# Altium footprint library 6-Connectors-2.PcbLib: 57 footprints (part 6 of 7) (continued)
## HARTING_09 06 231 6822 [mm] "DIN 41612, Type MH, 24+ 7 Contacts, Rows z+b+d, Performance level 2, Straight Female Connector"
height 20.53
pads (24):
  round 1.7 hole 1: b2(0,-2.54) b4(0,-7.62) b6(0,-12.7) b8(0,-17.78) b10(0,-22.86) b12(0,-27.94) b14(0,-33.02) b16(0,-38.1) d2(3.81,-2.54) d4(3.81,-7.62) d6(3.81,-12.7) d8(3.81,-17.78) d10(3.81,-22.86) d12(3.81,-27.94) d14(3.81,-33.02) d16(3.81,-38.1) z2(-3.81,-2.54) z4(-3.81,-7.62) z6(-3.81,-12.7) z8(-3.81,-17.78) z10(-3.81,-22.86) z12(-3.81,-27.94) z14(-3.81,-33.02) z16(-3.81,-38.1)
Top Overlay:
  lines w0.2: -5.025,-79.965 -1.475,-79.965 ; -5.025,-79.965 -5.025,-72.435 ; -5.025,-79.965 -1.475,-72.435 ; -5.025,-72.435 -1.475,-72.435 ; -5.025,-72.435 -1.475,-79.965 ; -5.025,-69.805 -1.475,-69.805 ; -5.025,-69.805 -5.025,-62.275 ; -5.025,-69.805 -1.475,-62.275 ; -5.025,-62.275 -1.475,-62.275 ; -5.025,-62.275 -1.475,-69.805 ; -5.025,-59.645 -1.475,-59.645 ; -5.025,-59.645 -5.025,-52.115 ; -5.025,-59.645 -1.475,-52.115 ; -5.025,-52.115 -1.475,-52.115 ; -5.025,-52.115 -1.475,-59.645 ; -5.025,-49.485 -1.475,-49.485 ; -5.025,-49.485 -5.025,-41.955 ; -5.025,-49.485 -1.475,-41.955 ; -5.025,-41.955 -1.475,-41.955 ; -5.025,-41.955 -1.475,-49.485 ; -1.475,-79.965 -1.475,-72.435 ; -1.475,-69.805 -1.475,-62.275 ; -1.475,-59.645 -1.475,-52.115 ; -1.475,-49.485 -1.475,-41.955 ; 1.475,-74.885 1.475,-67.355 ; 1.475,-74.885 5.025,-67.355 ; 1.475,-74.885 5.025,-74.885 ; 1.475,-67.355 5.025,-74.885 ; 1.475,-67.355 5.025,-67.355 ; 1.475,-64.725 5.025,-64.725 ; 1.475,-64.725 1.475,-57.195 ; 1.475,-64.725 5.025,-57.195 ; 1.475,-57.195 5.025,-57.195 ; 1.475,-57.195 5.025,-64.725 ; 1.475,-54.565 5.025,-54.565 ; 1.475,-54.565 1.475,-47.035 ; 1.475,-54.565 5.025,-47.035 ; 1.475,-47.035 5.025,-47.035 ; 1.475,-47.035 5.025,-54.565 ; 5.025,-74.885 5.025,-67.355 ; 5.025,-64.725 5.025,-57.195 ; 5.025,-54.565 5.025,-47.035 ; -7.35,-85.745 ccw(c-6.35,-85.745) -6.35,-86.745 6.35,-86.745 ccw(c6.35,-85.745) 7.35,-85.745 7.35,7.005 ccw(c6.35,7.005) 6.35,8.005 -6.35,8.005 ccw(c-6.35,7.005) -7.35,7.005 -7.35,-85.745 ; -6.185,-81.795 -6.185,3.055 6.185,3.055 6.185,-81.795 4.165,-81.795 4.165,-80.265 -4.165,-80.265 -4.165,-81.795 -6.185,-81.795
  text "30" at -10.109,-71.56 h1.2
  text "26" at -10.109,-61.4 h1.2
  text "22" at -10.109,-51.24 h1.2
  text "32" at -10.1,-76.605 h1.2
  text "28" at -10.1,-66.445 h1.2
  text "24" at -10.1,-56.285 h1.2
  text "d" at 3.492,-0.635 h1.2
  text "z" at -4.127,-0.635 h1.2
  text "b" at -0.318,-0.635 h1.2
  text "5" at -8.925,-10.725 h1.2
  text "10" at -9.885,-23.42 h1.2
  text "15" at -9.885,-36.12 h1.2
  text "20" at -10.1,-46.125 h1.2
  text "1" at -8.625,-0.525 h1.2
Mechanical 8:
  lines w0.1: -7.35,-40.64 -6.85,-40.64 ; -6.35,-40.64 -5.85,-40.64 ; -5.35,-40.64 -4.85,-40.64 ; -4.35,-40.64 -3.85,-40.64 ; -4.31,-38.1 -3.81,-38.1 ; -4.31,-33.02 -3.81,-33.02 ; -4.31,-27.94 -3.81,-27.94 ; -4.31,-22.86 -3.81,-22.86 ; -4.31,-17.78 -3.81,-17.78 ; -4.31,-12.7 -3.81,-12.7 ; -4.31,-7.62 -3.81,-7.62 ; -3.81,-38.6 -3.81,-38.1 ; -3.81,-37.6 -3.81,-38.1 ; -3.81,-33.52 -3.81,-33.02 ; -3.81,-32.52 -3.81,-33.02 ; -3.81,-28.44 -3.81,-27.94 ; -3.81,-27.44 -3.81,-27.94 ; -3.81,-23.36 -3.81,-22.86 ; -3.81,-22.36 -3.81,-22.86 ; -3.81,-18.28 -3.81,-17.78 ; -3.81,-17.28 -3.81,-17.78 ; -3.81,-13.2 -3.81,-12.7 ; -3.81,-12.2 -3.81,-12.7 ; -3.81,-8.12 -3.81,-7.62 ; -3.81,-7.12 -3.81,-7.62 ; -3.35,-40.64 -2.85,-40.64 ; -3.31,-38.1 -3.81,-38.1 ; -3.31,-33.02 -3.81,-33.02 ; -3.31,-27.94 -3.81,-27.94 ; -3.31,-22.86 -3.81,-22.86 ; -3.31,-17.78 -3.81,-17.78 ; -3.31,-12.7 -3.81,-12.7 ; -3.31,-7.62 -3.81,-7.62 ; -2.35,-40.64 -1.85,-40.64 ; -1.35,-40.64 -0.65,-40.64 ; -0.8,-84.37 -0.3,-84.37 ; -0.8,5.63 -0.3,5.63 ; -0.5,-38.1 0,-38.1 ; -0.5,-33.02 0,-33.02 ; -0.5,-27.94 0,-27.94 ; -0.5,-22.86 0,-22.86 ; -0.5,-17.78 0,-17.78 ; -0.5,-12.7 0,-12.7 ; -0.5,-7.62 0,-7.62 ; -0.5,-2.54 0,-2.54 ; -0.3,-84.87 -0.3,-84.37 ; -0.3,-83.87 -0.3,-84.37 ; -0.3,5.13 -0.3,5.63 ; -0.3,6.13 -0.3,5.63 ; -0.15,-40.64 0.35,-40.64 ; 0,-38.6 0,-38.1 ; 0,-37.6 0,-38.1 ; 0,-33.52 0,-33.02 ; 0,-32.52 0,-33.02 ; 0,-28.44 0,-27.94 ; 0,-27.44 0,-27.94 ; 0,-23.36 0,-22.86 ; 0,-22.36 0,-22.86 ; 0,-18.28 0,-17.78 ; 0,-17.28 0,-17.78 ; 0,-13.2 0,-12.7 ; 0,-12.2 0,-12.7 ; 0,-8.12 0,-7.62 ; 0,-7.12 0,-7.62 ; 0,-3.04 0,-2.54 ; 0,-2.04 0,-2.54 ; 0.2,-84.37 -0.3,-84.37 ; 0.2,5.63 -0.3,5.63 ; 0.5,-38.1 0,-38.1 ; 0.5,-33.02 0,-33.02 ; 0.5,-27.94 0,-27.94 ; 0.5,-22.86 0,-22.86 ; 0.5,-17.78 0,-17.78 ; 0.5,-12.7 0,-12.7 ; 0.5,-7.62 0,-7.62 ; 0.5,-2.54 0,-2.54 ; 0.85,-40.64 1.35,-40.64 ; 1.85,-40.64 2.35,-40.64 ; 2.85,-40.64 3.35,-40.64 ; 3.31,-38.1 3.81,-38.1 ; 3.31,-33.02 3.81,-33.02 ; 3.31,-27.94 3.81,-27.94 ; 3.31,-22.86 3.81,-22.86 ; 3.31,-17.78 3.81,-17.78 ; 3.31,-12.7 3.81,-12.7 ; 3.31,-7.62 3.81,-7.62 ; 3.31,-2.54 3.81,-2.54 ; 3.81,-38.6 3.81,-38.1 ; 3.81,-37.6 3.81,-38.1 ; 3.81,-33.52 3.81,-33.02 ; 3.81,-32.52 3.81,-33.02 ; 3.81,-28.44 3.81,-27.94 ; 3.81,-27.44 3.81,-27.94 ; 3.81,-23.36 3.81,-22.86 ; 3.81,-22.36 3.81,-22.86 ; 3.81,-18.28 3.81,-17.78 ; 3.81,-17.28 3.81,-17.78 ; 3.81,-13.2 3.81,-12.7 ; 3.81,-12.2 3.81,-12.7 ; 3.81,-8.12 3.81,-7.62 ; 3.81,-7.12 3.81,-7.62 ; 3.81,-3.04 3.81,-2.54 ; 3.81,-2.04 3.81,-2.54 ; 3.85,-40.64 4.35,-40.64 ; 4.31,-38.1 3.81,-38.1 ; 4.31,-33.02 3.81,-33.02 ; 4.31,-27.94 3.81,-27.94 ; 4.31,-22.86 3.81,-22.86 ; 4.31,-17.78 3.81,-17.78 ; 4.31,-12.7 3.81,-12.7 ; 4.31,-7.62 3.81,-7.62 ; 4.31,-2.54 3.81,-2.54 ; 4.85,-40.64 5.35,-40.64 ; 5.85,-40.64 6.35,-40.64 ; 6.85,-40.64 7.35,-40.64 ; -3.81,-2.54 -3.81,-3.04 -3.81,-2.54 ; -3.81,-2.54 -3.31,-2.54 -3.81,-2.54 ; -3.81,-2.54 -3.81,-2.04 -3.81,-2.54 ; -3.81,-2.54 -4.31,-2.54 -3.81,-2.54
Mechanical 14:
  drawing of 190 lines, arcs and shapes, not listed
  text "b" at -0.318,-0.635 h1.2
  text "z" at -4.127,-0.635 h1.2
  text "d" at 3.492,-0.635 h1.2
  text "30" at -10.109,-71.56 h1.2
  text "26" at -10.109,-61.4 h1.2
  text "22" at -10.109,-51.24 h1.2
  text "32" at -10.1,-76.605 h1.2
  text "28" at -10.1,-66.445 h1.2
  text "24" at -10.1,-56.285 h1.2
  text "5" at -8.925,-10.725 h1.2
  text "10" at -9.885,-23.42 h1.2
  text "15" at -9.885,-36.12 h1.2
  text "20" at -10.1,-46.125 h1.2
  text "1" at -8.625,-0.525 h1.2
3D body "HARTING_09 06 231 6822.stp": height 19.94, standoff -10.98, extent -7.35,-86.745 7.35,8.005

## HARTING_09 06 248 6832 [mm] "DIN 41612, Type F,  Thru-Hole Press-in Terminations;Rows z+b+d, 48 Contacts, Straight Female Connector, Performance level 2, Lead 5.6mm"
height 10.1
pads (50):
  round 1.7 hole 1: b2(3.81,-2.54) b4(3.81,-7.62) b6(3.81,-12.7) b8(3.81,-17.78) b10(3.81,-22.86) b12(3.81,-27.94) b14(3.81,-33.02) b16(3.81,-38.1) b18(3.81,-43.18) b20(3.81,-48.26) b22(3.81,-53.34) b24(3.81,-58.42) b26(3.81,-63.5) b28(3.81,-68.58) b30(3.81,-73.66) b32(3.81,-78.74) d2(7.62,-2.54) d4(7.62,-7.62) d6(7.62,-12.7) d8(7.62,-17.78) d10(7.62,-22.86) d12(7.62,-27.94) d14(7.62,-33.02) d16(7.62,-38.1) d18(7.62,-43.18) d20(7.62,-48.26) d22(7.62,-53.34) d24(7.62,-58.42) d26(7.62,-63.5) d28(7.62,-68.58) d30(7.62,-73.66) d32(7.62,-78.74) z2(0,-2.54) z4(0,-7.62) z6(0,-12.7) z8(0,-17.78) z10(0,-22.86) z12(0,-27.94) z14(0,-33.02) z16(0,-38.1) z18(0,-43.18) z20(0,-48.26) z22(0,-53.34) z24(0,-58.42) z26(0,-63.5) z28(0,-68.58) z30(0,-73.66) z32(0,-78.74)
  round 3.5 / inner round 3.5 / far side round 5.1 hole 2.8: MTG1(3.51,5.63) MTG2(3.51,-84.37)
Top Overlay:
  lines w0.2: -3.54,-85.22 -0.58,-85.22 -0.58,-81.845 ; -3.54,-79.57 -2.365,-79.57 ; -3.54,0.83 -2.365,0.83 ; -3.54,6.48 -0.58,6.48 -0.58,3.105 ; 0.535,-86.82 0.535,-84.37 1.993,-81.845 ; 0.535,8.08 0.535,5.63 1.993,3.105 ; 2.492,-86.82 -2.54,-86.82 cw(c-2.54,-85.82) -3.54,-85.82 -3.54,7.08 cw(c-2.54,7.08) -2.54,8.08 2.492,8.08 ; 4.874,-86.82 10.16,-86.82 ccw(c10.16,-85.82) 11.16,-85.82 11.16,7.08 ccw(c10.16,7.08) 10.16,8.08 4.874,8.08 ; 5.027,-81.845 6.485,-84.37 6.485,-86.82 ; 5.027,3.105 6.485,5.63 6.485,8.08 ; 8.17,-81.845 8.17,-85.22 11.16,-85.22 ; 8.17,3.105 8.17,6.48 11.16,6.48 ; 9.985,-79.57 11.16,-79.57 ; 9.985,0.83 11.16,0.83 ; -2.365,-81.845 9.985,-81.845 9.985,3.105 -2.365,3.105 -2.365,-81.845
  text "b" at 3.493,-0.635 h1.2
  text "z" at -0.317,-0.635 h1.2
  text "d" at 7.303,-0.635 h1.2
  text "1" at -4.49,-0.6 h1.2
  text "30" at -5.967,-74.295 h1.2
  text "25" at -5.967,-61.595 h1.2
  text "20" at -5.967,-48.895 h1.2
  text "15" at -5.75,-36.195 h1.2
  text "10" at -5.75,-23.495 h1.2
  text "5" at -4.79,-10.8 h1.2
  text "32" at -5.99,-79.4 h1.2
Mechanical 8:
  lines w0.1: 2.81,-40.64 3.81,-40.64 3.81,-41.64
Mechanical 14:
  circle w0.1: c3.51,5.63 r1.4
  circle w0.1: c3.51,-84.37 r1.4
  lines w0.1: -3.54,-85.22 -0.58,-85.22 -0.58,-81.845 ; -3.54,-79.57 -2.365,-79.57 ; -3.54,0.83 -2.365,0.83 ; -3.54,6.48 -0.58,6.48 -0.58,3.105 ; 0.535,-86.82 0.535,-84.37 1.993,-81.845 ; 0.535,8.08 0.535,5.63 1.993,3.105 ; 5.027,-81.845 6.485,-84.37 6.485,-86.82 ; 5.027,3.105 6.485,5.63 6.485,8.08 ; 8.17,-81.845 8.17,-85.22 11.16,-85.22 ; 8.17,3.105 8.17,6.48 11.16,6.48 ; 9.985,-79.57 11.16,-79.57 ; 9.985,0.83 11.16,0.83 ; -3.54,-85.82 ccw(c-2.54,-85.82) -2.54,-86.82 10.16,-86.82 ccw(c10.16,-85.82) 11.16,-85.82 11.16,7.08 ccw(c10.16,7.08) 10.16,8.08 -2.54,8.08 ccw(c-2.54,7.08) -3.54,7.08 -3.54,-85.82 ; -2.365,-81.845 -2.365,3.105 9.985,3.105 9.985,-81.845 -2.365,-81.845
  text "d" at 7.303,-0.635 h1.2
  text "z" at -0.317,-0.635 h1.2
  text "b" at 3.493,-0.635 h1.2
  text "1" at -4.49,-0.6 h1.2
  text "30" at -5.967,-74.295 h1.2
  text "25" at -5.967,-61.595 h1.2
  text "20" at -5.967,-48.895 h1.2
  text "15" at -5.75,-36.195 h1.2
  text "10" at -5.75,-23.495 h1.2
  text "5" at -4.79,-10.8 h1.2
  text "32" at -5.99,-79.4 h1.2
Drill Drawing:
  lines w0.1: -2.54,-60.96 -2.54,-81 9.985,-81 9.985,0 -2.54,0 -2.54,-22.86
  text "PRESS-FIT TECHNOLOGY diam. 1mm +0.1 -0" at -1.905,-59.055 h1
3D body "HARTING_09 06 248 6832.stp": height 10.1, standoff -3.1, extent -3.59,-86.82 11.21,8.08

## HARTING_09 06 248 7833 [mm] "DIN 41612, Type F, 48 Contacts, Rows z+b+d, Performance level 3, Straight Female Connector"
height 10.1
pads (50):
  round 1.7 hole 1: b2(3.81,-2.54) b4(3.81,-7.62) b6(3.81,-12.7) b8(3.81,-17.78) b10(3.81,-22.86) b12(3.81,-27.94) b14(3.81,-33.02) b16(3.81,-38.1) b18(3.81,-43.18) b20(3.81,-48.26) b22(3.81,-53.34) b24(3.81,-58.42) b26(3.81,-63.5) b28(3.81,-68.58) b30(3.81,-73.66) b32(3.81,-78.74) d2(7.62,-2.54) d4(7.62,-7.62) d6(7.62,-12.7) d8(7.62,-17.78) d10(7.62,-22.86) d12(7.62,-27.94) d14(7.62,-33.02) d16(7.62,-38.1) d18(7.62,-43.18) d20(7.62,-48.26) d22(7.62,-53.34) d24(7.62,-58.42) d26(7.62,-63.5) d28(7.62,-68.58) d30(7.62,-73.66) d32(7.62,-78.74) z2(0,-2.54) z4(0,-7.62) z6(0,-12.7) z8(0,-17.78) z10(0,-22.86) z12(0,-27.94) z14(0,-33.02) z16(0,-38.1) z18(0,-43.18) z20(0,-48.26) z22(0,-53.34) z24(0,-58.42) z26(0,-63.5) z28(0,-68.58) z30(0,-73.66) z32(0,-78.74)
  round 3.5 / inner round 3.5 / far side round 5.1 hole 2.8: MTG1(3.51,5.63) MTG2(3.51,-84.37)
Top Overlay:
  lines w0.2: -3.54,-85.22 -0.58,-85.22 -0.58,-81.845 ; -3.54,-79.57 -2.365,-79.57 ; -3.54,0.83 -2.365,0.83 ; -3.54,6.48 -0.58,6.48 -0.58,3.105 ; 0.535,-86.82 0.535,-84.37 1.993,-81.845 ; 0.535,8.08 0.535,5.63 1.993,3.105 ; 2.492,-86.82 -2.54,-86.82 cw(c-2.54,-85.82) -3.54,-85.82 -3.54,7.08 cw(c-2.54,7.08) -2.54,8.08 2.492,8.08 ; 4.874,-86.82 10.16,-86.82 ccw(c10.16,-85.82) 11.16,-85.82 11.16,7.08 ccw(c10.16,7.08) 10.16,8.08 4.874,8.08 ; 5.027,-81.845 6.485,-84.37 6.485,-86.82 ; 5.027,3.105 6.485,5.63 6.485,8.08 ; 8.17,-81.845 8.17,-85.22 11.16,-85.22 ; 8.17,3.105 8.17,6.48 11.16,6.48 ; 9.985,-79.57 11.16,-79.57 ; 9.985,0.83 11.16,0.83 ; -2.365,-81.845 -2.365,3.105 9.985,3.105 9.985,-81.845 -2.365,-81.845
  text "d" at 7.303,-0.635 h1.2
  text "z" at -0.317,-0.635 h1.2
  text "b" at 3.493,-0.635 h1.2
  text "32" at -6.265,-79.35 h1.2
  text "5" at -5.065,-10.75 h1.2
  text "10" at -6.025,-23.445 h1.2
  text "15" at -6.025,-36.145 h1.2
  text "20" at -6.242,-48.845 h1.2
  text "25" at -6.242,-61.545 h1.2
  text "30" at -6.242,-74.245 h1.2
  text "1" at -4.765,-0.55 h1.2
Mechanical 8:
  lines w0.1: 2.81,-40.64 3.81,-40.64 3.81,-41.64
Mechanical 14:
  circle w0.1: c3.51,-84.37 r1.4
  circle w0.1: c3.51,5.63 r1.4
  lines w0.1: -3.54,-85.22 -0.58,-85.22 -0.58,-81.845 ; -3.54,-79.57 -2.365,-79.57 ; -3.54,0.83 -2.365,0.83 ; -3.54,6.48 -0.58,6.48 -0.58,3.105 ; 0.535,-86.82 0.535,-84.37 1.993,-81.845 ; 0.535,8.08 0.535,5.63 1.993,3.105 ; 5.027,-81.845 6.485,-84.37 6.485,-86.82 ; 5.027,3.105 6.485,5.63 6.485,8.08 ; 8.17,-81.845 8.17,-85.22 11.16,-85.22 ; 8.17,3.105 8.17,6.48 11.16,6.48 ; 9.985,-79.57 11.16,-79.57 ; 9.985,0.83 11.16,0.83 ; -3.54,-85.82 ccw(c-2.54,-85.82) -2.54,-86.82 10.16,-86.82 ccw(c10.16,-85.82) 11.16,-85.82 11.16,7.08 ccw(c10.16,7.08) 10.16,8.08 -2.54,8.08 ccw(c-2.54,7.08) -3.54,7.08 -3.54,-85.82 ; -2.365,-81.845 9.985,-81.845 9.985,3.105 -2.365,3.105 -2.365,-81.845
  text "b" at 3.493,-0.635 h1.2
  text "z" at -0.317,-0.635 h1.2
  text "d" at 7.303,-0.635 h1.2
  text "32" at -6.265,-79.35 h1.2
  text "5" at -5.065,-10.75 h1.2
  text "10" at -6.025,-23.445 h1.2
  text "15" at -6.025,-36.145 h1.2
  text "20" at -6.242,-48.845 h1.2
  text "25" at -6.242,-61.545 h1.2
  text "30" at -6.242,-74.245 h1.2
  text "1" at -4.765,-0.55 h1.2
3D body "HARTING_09 06 248 7833.stp": height 10.1, standoff -3.1, extent -3.59,-86.82 11.21,8.08

## HARTING_09 22 132 6921 [mm] "Connector; DIN 41612, Type 2B, Thru-Hole; Rows a+b, 32 Position; Right Angle"
height 8.5
pads (34):
  round 1.7 hole 1: a1(0,0) a2(0,-2.54) a3(0,-5.08) a4(0,-7.62) a5(0,-10.16) a6(0,-12.7) a7(0,-15.24) a8(0,-17.78) a9(0,-20.32) a10(0,-22.86) a11(0,-25.4) a12(0,-27.94) a13(0,-30.48) a14(0,-33.02) a15(0,-35.56) a16(0,-38.1) b1(-2.54,0) b2(-2.54,-2.54) b3(-2.54,-5.08) b4(-2.54,-7.62) b5(-2.54,-10.16) b6(-2.54,-12.7) b7(-2.54,-15.24) b8(-2.54,-17.78) b9(-2.54,-20.32) b10(-2.54,-22.86) b11(-2.54,-25.4) b12(-2.54,-27.94) b13(-2.54,-30.48) b14(-2.54,-33.02) b15(-2.54,-35.56) b16(-2.54,-38.1)
  round 3.5 / inner round 3.5 / far side round 5.1 hole 2.8: MTG1(2.54,5.08) MTG2(2.54,-43.18)
Top Overlay:
  lines w0.2: 2.04,-40.18 -0.36,-40.18 -0.36,-46.05 7.69,-46.05 7.69,-42.5 ; 2.04,2.08 -0.36,2.08 -0.36,7.95 7.69,7.95 7.69,4.4 ; 4.32,-41.15 3.847,-40.33 2.04,-40.33 2.04,2.23 3.847,2.23 4.32,3.05 ; 5.3,-42.5 12.64,-42.5 12.64,4.4 5.3,4.4
  text "15" at -5.855,-36.235 h1.2
  text "1" at -4.58,-0.7 h1.2
  text "b" at -2.56,1.87 h1.2
  text "a" at -1.12,1.87 h1.2
  text "5" at -4.93,-10.735 h1.2
  text "10" at -5.855,-23.535 h1.2
Mechanical 8:
  drawing of 209 lines, arcs and shapes, not listed
  text "PCB" at 5.055,-19.45 h1.2
Mechanical 14:
  circle w0.1: c2.54,5.08 r1.25
  circle w0.1: c2.54,-43.18 r1.25
  lines w0.1: 2.04,-40.18 -0.36,-40.18 -0.36,-46.05 7.69,-46.05 7.69,-42.5 ; 2.04,2.08 -0.36,2.08 -0.36,7.95 7.69,7.95 7.69,4.4 ; 2.04,-40.33 3.847,-40.33 5.1,-42.5 12.64,-42.5 12.64,4.4 5.1,4.4 3.847,2.23 2.04,2.23 2.04,-40.33
  text "15" at -5.855,-36.235 h1.2
  text "10" at -5.855,-23.535 h1.2
  text "1" at -4.58,-0.7 h1.2
  text "5" at -4.93,-10.735 h1.2
3D body "v160-080.stp": height 0.02, standoff -1.65, extent -3.34,-38.9 -1.74,-37.3
3D body "v160-080.stp": height 0.02, standoff -1.65, extent -0.8,-38.9 0.8,-37.3
3D body "v160-080.stp": height 0.02, standoff -1.65, extent -3.34,-36.36 -1.74,-34.76
3D body "v160-080.stp": height 0.02, standoff -1.65, extent -0.8,-36.36 0.8,-34.76
3D body "v160-080.stp": height 0.02, standoff -1.65, extent -3.34,-33.82 -1.74,-32.22
3D body "v160-080.stp": height 0.02, standoff -1.65, extent -0.8,-33.82 0.8,-32.22
3D body "v160-080.stp": height 0.02, standoff -1.65, extent -3.34,-31.28 -1.74,-29.68
3D body "v160-080.stp": height 0.02, standoff -1.65, extent -0.8,-31.28 0.8,-29.68
3D body "v160-080.stp": height 0.02, standoff -1.65, extent -3.34,-28.74 -1.74,-27.14
3D body "v160-080.stp": height 0.02, standoff -1.65, extent -0.8,-28.74 0.8,-27.14
3D body "v160-080.stp": height 0.02, standoff -1.65, extent -3.34,-26.2 -1.74,-24.6
3D body "v160-080.stp": height 0.02, standoff -1.65, extent -0.8,-26.2 0.8,-24.6
3D body "v160-080.stp": height 0.02, standoff -1.65, extent -3.34,-23.66 -1.74,-22.06
3D body "v160-080.stp": height 0.02, standoff -1.65, extent -0.8,-23.66 0.8,-22.06
3D body "v160-080.stp": height 0.02, standoff -1.65, extent -3.34,-21.12 -1.74,-19.52
3D body "v160-080.stp": height 0.02, standoff -1.65, extent -0.8,-21.12 0.8,-19.52
3D body "v160-080.stp": height 0.02, standoff -1.65, extent -3.34,-18.58 -1.74,-16.98
3D body "v160-080.stp": height 0.02, standoff -1.65, extent -0.8,-18.58 0.8,-16.98
3D body "v160-080.stp": height 0.02, standoff -1.65, extent -3.34,-16.04 -1.74,-14.44
3D body "v160-080.stp": height 0.02, standoff -1.65, extent -0.8,-16.04 0.8,-14.44
3D body "v160-080.stp": height 0.02, standoff -1.65, extent -3.34,-13.5 -1.74,-11.9
3D body "v160-080.stp": height 0.02, standoff -1.65, extent -0.8,-13.5 0.8,-11.9
3D body "v160-080.stp": height 0.02, standoff -1.65, extent -3.34,-10.96 -1.74,-9.36
3D body "v160-080.stp": height 0.02, standoff -1.65, extent -0.8,-10.96 0.8,-9.36
3D body "v160-080.stp": height 0.02, standoff -1.65, extent -3.34,-8.42 -1.74,-6.82
3D body "v160-080.stp": height 0.02, standoff -1.65, extent -0.8,-8.42 0.8,-6.82
3D body "v160-080.stp": height 0.02, standoff -1.65, extent -3.34,-5.88 -1.74,-4.28
3D body "v160-080.stp": height 0.02, standoff -1.65, extent -0.8,-5.88 0.8,-4.28
3D body "v160-080.stp": height 0.02, standoff -1.65, extent -3.34,-3.34 -1.74,-1.74
3D body "v160-080.stp": height 0.02, standoff -1.65, extent -0.8,-3.34 0.8,-1.74
3D body "v160-080.stp": height 0.02, standoff -1.65, extent -3.34,-0.8 -1.74,0.8
3D body "v160-080.stp": height 0.02, standoff -1.65, extent -0.8,-0.8 0.8,0.8
3D body "HARTING_09 22 132 6921.stp": height 6.83, standoff -3, extent -2.79,-46.05 12.64,7.95

## HARTING_09 22 232 6850 [mm] "DIN 41612, Type 2B, Thru-Hole Press-in Terminations;  Rows a+b, 32 Positions, Performance level 2, Lead 4.5 mm, Pitch 2.54mm, Straight Female Connector"
height 11.6
pads (34):
  round 1.7 hole 1: a1(0,0) a2(0,-2.54) a3(0,-5.08) a4(0,-7.62) a5(0,-10.16) a6(0,-12.7) a7(0,-15.24) a8(0,-17.78) a9(0,-20.32) a10(0,-22.86) a11(0,-25.4) a12(0,-27.94) a13(0,-30.48) a14(0,-33.02) a15(0,-35.56) a16(0,-38.1) b1(2.54,0) b2(2.54,-2.54) b3(2.54,-5.08) b4(2.54,-7.62) b5(2.54,-10.16) b6(2.54,-12.7) b7(2.54,-15.24) b8(2.54,-17.78) b9(2.54,-20.32) b10(2.54,-22.86) b11(2.54,-25.4) b12(2.54,-27.94) b13(2.54,-30.48) b14(2.54,-33.02) b15(2.54,-35.56) b16(2.54,-38.1)
  round 3.5 / inner round 3.5 / far side round 5.1 hole 2.8: MTG1(2.24,5.95) MTG2(2.24,-44.05)
Top Overlay:
  lines w0.2: -2.73,-44.05 -0.71,-44.05 ; -2.73,5.95 -0.71,5.95 ; -1.08,-37.705 -1.08,-40.6 ; -1.08,0.395 -1.08,2.5 ; -0.71,-46.5 -0.71,-44.05 ; -0.71,8.4 -0.71,5.95 ; -0.214,-43.191 -0.71,-44.05 ; -0.214,5.091 -0.71,5.95 ; 0.269,-42.354 0.907,-41.25 3.653,-41.25 4.375,-42.5 5.27,-42.5 ; 0.269,4.254 0.907,3.15 3.025,3.15 ; 1.37,-46.5 -2.73,-46.5 -2.73,8.4 1.37,8.4 ; 3.11,-46.5 5.27,-46.5 5.27,8.4 3.11,8.4 ; 3.62,-38.495 3.62,-39.55 ; 3.62,0.395 3.62,1.45 ; 4.014,3.775 4.375,4.4 5.27,4.4 ; -1.73,-41.25 -1.08,-40.6 ; -1.73,-41.25 -1.73,3.15 ; -1.73,-41.25 1.17,-41.25 ; -1.73,3.15 -1.08,2.5 ; -1.73,3.15 1.17,3.15 ; -1.08,-40.6 0.52,-40.6 ; -1.08,2.5 0.52,2.5 ; 0.52,-40.6 1.17,-41.25 ; 0.52,-40.6 0.52,-39.55 ; 0.52,-39.55 1.17,-40.2 ; 0.52,-39.55 3.62,-39.55 ; 0.52,1.45 1.17,2.1 ; 0.52,1.45 3.62,1.45 ; 0.52,1.45 0.52,2.5 ; 0.52,2.5 1.17,3.15 ; 1.17,-41.25 1.17,-40.2 ; 1.17,-40.2 4.27,-40.2 ; 1.17,2.1 4.27,2.1 ; 1.17,2.1 1.17,3.15 ; 3.62,-39.55 4.27,-40.2 ; 3.62,1.45 4.27,2.1 ; 4.27,-40.2 4.27,2.1
  text "a" at -0.575,3.725 h1.2
  text "b" at 4.65,2.55 h1.2
  text "10" at -5.34,-23.51 h1.2
  text "5" at -4.415,-10.71 h1.2
  text "1" at -4.065,-0.675 h1.2
  text "15" at -5.34,-36.21 h1.2
Mechanical 8:
  lines w0.1: 0,-38.1 -0.5,-38.1 0,-38.1 ; 0,-38.1 0,-38.6 0,-38.1 ; 0,-38.1 0.5,-38.1 0,-38.1 ; 0,-38.1 0,-37.6 0,-38.1 ; 0,0 -0.5,0 0,0 ; 0,0 0,-0.5 0,0 ; 0,0 0.5,0 0,0 ; 0,0 0,0.5 0,0 ; 2.24,-44.05 1.74,-44.05 2.24,-44.05 ; 2.24,-44.05 2.24,-44.55 2.24,-44.05 ; 2.24,-44.05 2.74,-44.05 2.24,-44.05 ; 2.24,-44.05 2.24,-43.55 2.24,-44.05 ; 2.24,5.95 1.74,5.95 2.24,5.95 ; 2.24,5.95 2.24,5.45 2.24,5.95 ; 2.24,5.95 2.74,5.95 2.24,5.95 ; 2.24,5.95 2.24,6.45 2.24,5.95 ; 2.54,-38.1 2.04,-38.1 2.54,-38.1 ; 2.54,-38.1 2.54,-38.6 2.54,-38.1 ; 2.54,-38.1 3.04,-38.1 2.54,-38.1 ; 2.54,-38.1 2.54,-37.6 2.54,-38.1 ; 2.54,0 2.04,0 2.54,0 ; 2.54,0 2.54,-0.5 2.54,0 ; 2.54,0 3.04,0 2.54,0 ; 2.54,0 2.54,0.5 2.54,0
Mechanical 14:
  drawing of 426 lines, arcs and shapes, not listed
  text "b" at 4.65,2.55 h1.2
  text "a" at -0.575,3.725 h1.2
  text "5" at -4.415,-10.71 h1.2
  text "1" at -4.065,-0.675 h1.2
  text "10" at -5.34,-23.51 h1.2
  text "15" at -5.34,-36.21 h1.2
Drill Drawing:
  lines w0.1: -2.73,-39.5 5.27,-39.5 5.27,1.5 -2.73,1.5 -2.73,-39.5
  text "PRESS-FIT TECHNOLOGY diam. 1mm +0.1 -0" at -1.325,-37.125 h1
3D body "HARTING_09 22 232 6850.stp": height 11.6, standoff -4.5, extent -2.73,-46.5 5.27,8.4

## HARTING_09 23 148 6921 [mm] "DIN 41612, Type 2C, Thru-Hole;  Rows a+b+c, 48 Position, Performance level 2, Lead 3.0 mm, Pitch 2.54mm, Right Angle Male Connector"
height 11
pads (50):
  round 1.7 hole 1: a1(0,0) a2(0,-2.54) a3(0,-5.08) a4(0,-7.62) a5(0,-10.16) a6(0,-12.7) a7(0,-15.24) a8(0,-17.78) a9(0,-20.32) a10(0,-22.86) a11(0,-25.4) a12(0,-27.94) a13(0,-30.48) a14(0,-33.02) a15(0,-35.56) a16(0,-38.1) b1(-2.54,0) b2(-2.54,-2.54) b3(-2.54,-5.08) b4(-2.54,-7.62) b5(-2.54,-10.16) b6(-2.54,-12.7) b7(-2.54,-15.24) b8(-2.54,-17.78) b9(-2.54,-20.32) b10(-2.54,-22.86) b11(-2.54,-25.4) b12(-2.54,-27.94) b13(-2.54,-30.48) b14(-2.54,-33.02) b15(-2.54,-35.56) b16(-2.54,-38.1) c1(-5.08,0) c2(-5.08,-2.54) c3(-5.08,-5.08) c4(-5.08,-7.62) c5(-5.08,-10.16) c6(-5.08,-12.7) c7(-5.08,-15.24) c8(-5.08,-17.78) c9(-5.08,-20.32) c10(-5.08,-22.86) c11(-5.08,-25.4) c12(-5.08,-27.94) c13(-5.08,-30.48) c14(-5.08,-33.02) c15(-5.08,-35.56) c16(-5.08,-38.1)
  round 3.5 / inner round 3.5 / far side round 5.1 hole 2.8: MTG1(2.54,5.08) MTG2(2.54,-43.18)
Top Overlay:
  lines w0.2: 2.04,-40.33 2.04,2.23 ; 7.69,-42.5 7.69,-46.05 -0.36,-46.05 -0.36,-40.33 3.897,-40.33 5.15,-42.5 12.64,-42.5 12.64,4.4 5.15,4.4 3.897,2.23 -0.36,2.23 -0.36,7.95 7.69,7.95 7.69,4.4
Mechanical 8:
  lines w0.1: -5.58,-38.1 -5.08,-38.1 ; -5.58,0 -5.08,0 ; -5.08,-38.6 -5.08,-38.1 ; -5.08,-37.6 -5.08,-38.1 ; -5.08,-0.5 -5.08,0 ; -5.08,0.5 -5.08,0 ; -4.58,-38.1 -5.08,-38.1 ; -4.58,0 -5.08,0 ; -3.04,-38.1 -2.54,-38.1 ; -3.04,0 -2.54,0 ; -2.54,-38.6 -2.54,-38.1 ; -2.54,-37.6 -2.54,-38.1 ; -2.54,-0.5 -2.54,0 ; -2.54,0.5 -2.54,0 ; -2.04,-38.1 -2.54,-38.1 ; -2.04,0 -2.54,0 ; -0.5,-38.1 0,-38.1 ; -0.5,0 0,0 ; 0,-38.6 0,-38.1 ; 0,-37.6 0,-38.1 ; 0,-0.5 0,0 ; 0,0.5 0,0 ; 0.5,-38.1 0,-38.1 ; 0.5,0 0,0 ; 2.04,-43.18 2.54,-43.18 ; 2.04,5.08 2.54,5.08 ; 2.54,-43.68 2.54,-43.18 ; 2.54,-42.68 2.54,-43.18 ; 2.54,4.58 2.54,5.08 ; 2.54,5.58 2.54,5.08 ; 3.04,-43.18 2.54,-43.18 ; 3.04,5.08 2.54,5.08 ; 5.3,-46.05 5.3,-19.05 5.3,7.95
Mechanical 14:
  circle w0.1: c2.54,5.08 r1.25
  circle w0.1: c2.54,-43.18 r1.25
  lines w0.1: 2.04,-40.33 2.04,2.23 ; 7.69,-42.5 7.69,-46.05 -0.36,-46.05 -0.36,-40.33 3.897,-40.33 5.15,-42.5 12.64,-42.5 12.64,4.4 5.15,4.4 3.897,2.23 -0.36,2.23 -0.36,7.95 7.69,7.95 7.69,4.4
3D body "v160-080.stp": height 0.02, standoff -1.65, extent -3.34,-38.9 -1.74,-37.3
3D body "v160-080.stp": height 0.02, standoff -1.65, extent -0.8,-38.9 0.8,-37.3
3D body "v160-080.stp": height 0.02, standoff -1.65, extent -5.88,-38.9 -4.28,-37.3
3D body "v160-080.stp": height 0.02, standoff -1.65, extent -3.34,-36.36 -1.74,-34.76
3D body "v160-080.stp": height 0.02, standoff -1.65, extent -0.8,-36.36 0.8,-34.76
3D body "v160-080.stp": height 0.02, standoff -1.65, extent -5.88,-36.36 -4.28,-34.76
3D body "v160-080.stp": height 0.02, standoff -1.65, extent -3.34,-33.82 -1.74,-32.22
3D body "v160-080.stp": height 0.02, standoff -1.65, extent -0.8,-33.82 0.8,-32.22
3D body "v160-080.stp": height 0.02, standoff -1.65, extent -5.88,-33.82 -4.28,-32.22
3D body "v160-080.stp": height 0.02, standoff -1.65, extent -3.34,-31.28 -1.74,-29.68
3D body "v160-080.stp": height 0.02, standoff -1.65, extent -0.8,-31.28 0.8,-29.68
3D body "v160-080.stp": height 0.02, standoff -1.65, extent -5.88,-31.28 -4.28,-29.68
3D body "v160-080.stp": height 0.02, standoff -1.65, extent -3.34,-28.74 -1.74,-27.14
3D body "v160-080.stp": height 0.02, standoff -1.65, extent -0.8,-28.74 0.8,-27.14
3D body "v160-080.stp": height 0.02, standoff -1.65, extent -5.88,-28.74 -4.28,-27.14
3D body "v160-080.stp": height 0.02, standoff -1.65, extent -3.34,-26.2 -1.74,-24.6
3D body "v160-080.stp": height 0.02, standoff -1.65, extent -0.8,-26.2 0.8,-24.6
3D body "v160-080.stp": height 0.02, standoff -1.65, extent -5.88,-26.2 -4.28,-24.6
3D body "v160-080.stp": height 0.02, standoff -1.65, extent -3.34,-23.66 -1.74,-22.06
3D body "v160-080.stp": height 0.02, standoff -1.65, extent -0.8,-23.66 0.8,-22.06
3D body "v160-080.stp": height 0.02, standoff -1.65, extent -5.88,-23.66 -4.28,-22.06
3D body "v160-080.stp": height 0.02, standoff -1.65, extent -3.34,-21.12 -1.74,-19.52
3D body "v160-080.stp": height 0.02, standoff -1.65, extent -0.8,-21.12 0.8,-19.52
3D body "v160-080.stp": height 0.02, standoff -1.65, extent -5.88,-21.12 -4.28,-19.52
3D body "v160-080.stp": height 0.02, standoff -1.65, extent -3.34,-18.58 -1.74,-16.98
3D body "v160-080.stp": height 0.02, standoff -1.65, extent -0.8,-18.58 0.8,-16.98
3D body "v160-080.stp": height 0.02, standoff -1.65, extent -5.88,-18.58 -4.28,-16.98
3D body "v160-080.stp": height 0.02, standoff -1.65, extent -3.34,-16.04 -1.74,-14.44
3D body "v160-080.stp": height 0.02, standoff -1.65, extent -0.8,-16.04 0.8,-14.44
3D body "v160-080.stp": height 0.02, standoff -1.65, extent -5.88,-16.04 -4.28,-14.44
3D body "v160-080.stp": height 0.02, standoff -1.65, extent -3.34,-13.5 -1.74,-11.9
3D body "v160-080.stp": height 0.02, standoff -1.65, extent -0.8,-13.5 0.8,-11.9
3D body "v160-080.stp": height 0.02, standoff -1.65, extent -5.88,-13.5 -4.28,-11.9
3D body "v160-080.stp": height 0.02, standoff -1.65, extent -3.34,-10.96 -1.74,-9.36
3D body "v160-080.stp": height 0.02, standoff -1.65, extent -0.8,-10.96 0.8,-9.36
3D body "v160-080.stp": height 0.02, standoff -1.65, extent -5.88,-10.96 -4.28,-9.36
3D body "v160-080.stp": height 0.02, standoff -1.65, extent -3.34,-8.42 -1.74,-6.82
3D body "v160-080.stp": height 0.02, standoff -1.65, extent -0.8,-8.42 0.8,-6.82
3D body "v160-080.stp": height 0.02, standoff -1.65, extent -5.88,-8.42 -4.28,-6.82
3D body "v160-080.stp": height 0.02, standoff -1.65, extent -3.34,-5.88 -1.74,-4.28
3D body "v160-080.stp": height 0.02, standoff -1.65, extent -0.8,-5.88 0.8,-4.28
3D body "v160-080.stp": height 0.02, standoff -1.65, extent -5.88,-5.88 -4.28,-4.28
3D body "v160-080.stp": height 0.02, standoff -1.65, extent -3.34,-3.34 -1.74,-1.74
3D body "v160-080.stp": height 0.02, standoff -1.65, extent -0.8,-3.34 0.8,-1.74
3D body "v160-080.stp": height 0.02, standoff -1.65, extent -5.88,-3.34 -4.28,-1.74
3D body "v160-080.stp": height 0.02, standoff -1.65, extent -3.34,-0.8 -1.74,0.8
3D body "v160-080.stp": height 0.02, standoff -1.65, extent -0.8,-0.8 0.8,0.8
3D body "v160-080.stp": height 0.02, standoff -1.65, extent -5.88,-0.8 -4.28,0.8
3D body "HARTING_09 23 148 6921.stp": height 9.35, standoff -3, extent -5.33,-46.05 12.64,7.95